# Altium footprint library AltiumDesignerLibraries.PcbLib: 313 footprints (part 11 of 20)
Each footprint in its own frame and in the unit in brackets; x right, y up, seen from the top. Pads: shape width x height; smd on the part's side, far side on the other; paste and mask are expansions set on the pad; w line width, h text height; cw(c..) or ccw(c..) is an arc to the next point about the centre after c.
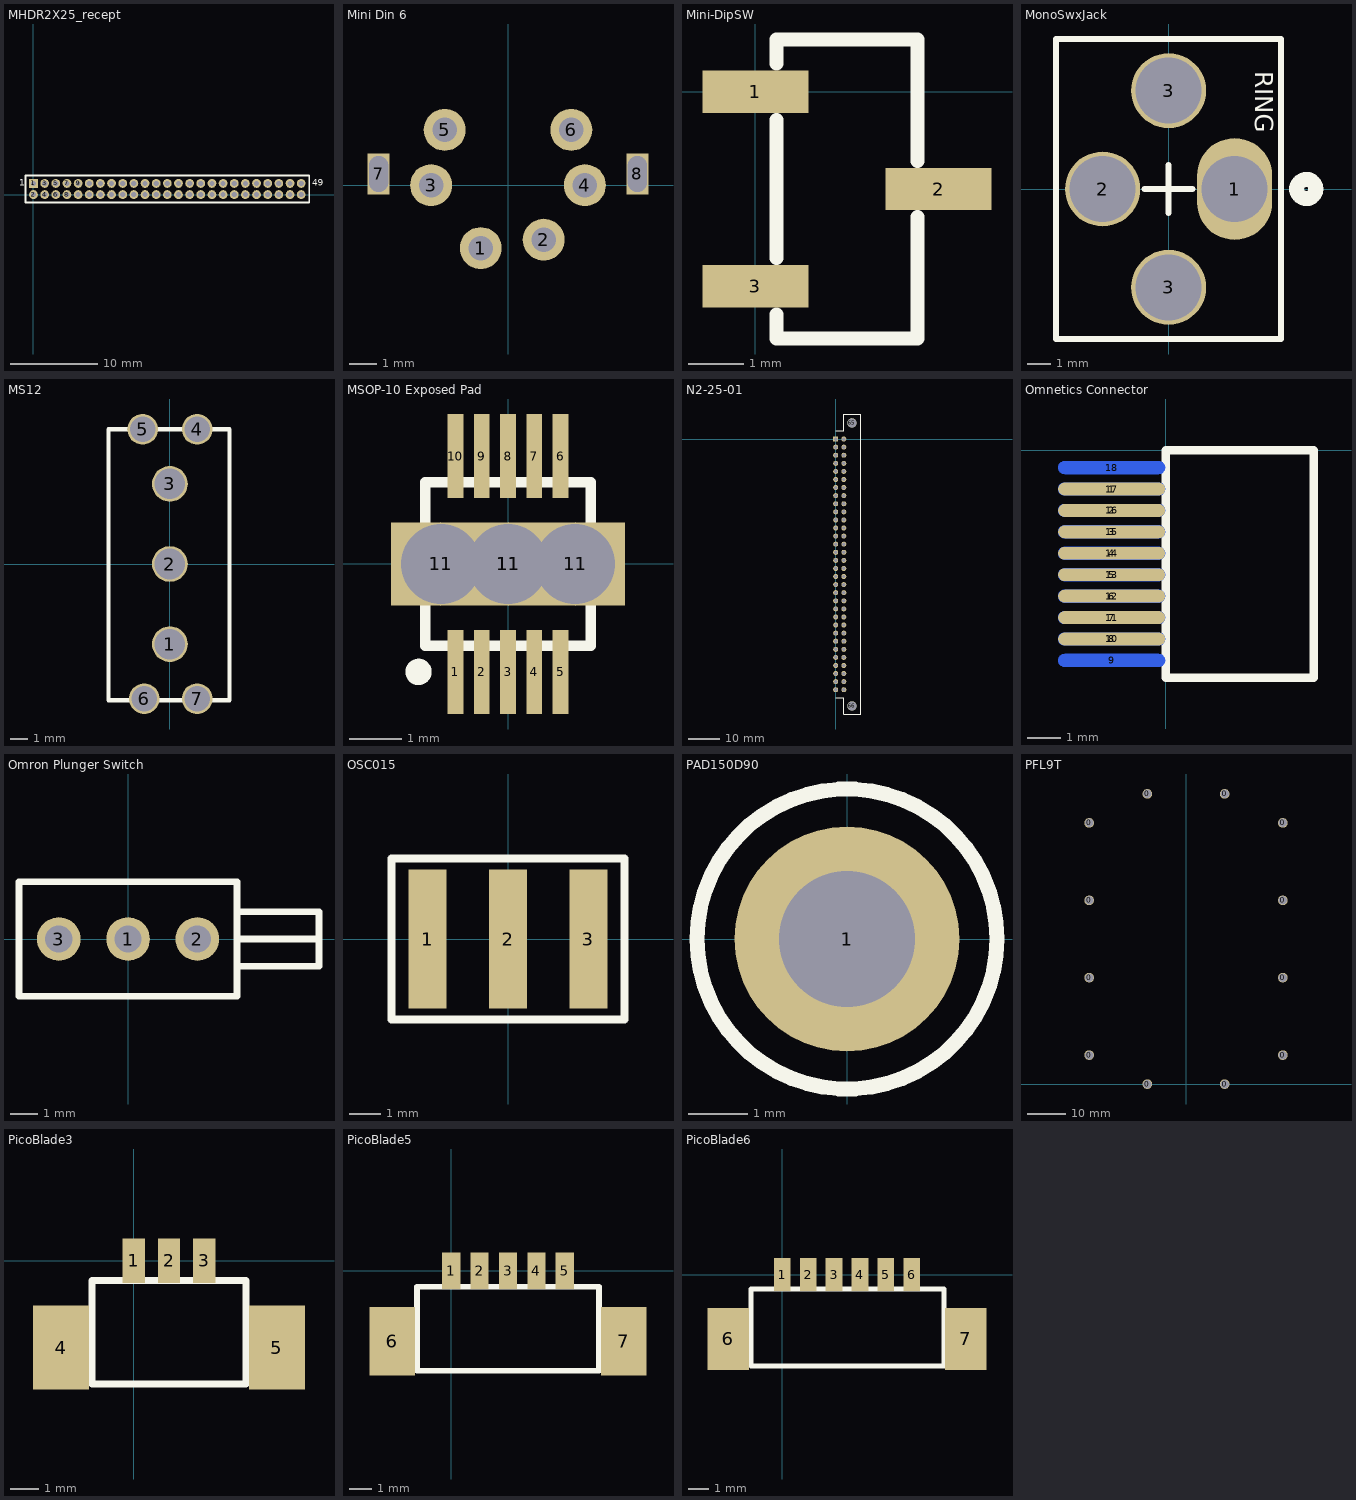
[diagram p10: the footprints below, top view; thin cyan lines are the x and y axes]

## MHDR2X25_recept [mm]
pads (50):
  rect 1x1 hole 0.6: 1(0,1.27)
  round 1 hole 0.6: 2(0,0) 3(1.27,1.27) 4(1.27,0) 5(2.54,1.27) 6(2.54,0) 7(3.81,1.27) 8(3.81,0) 9(5.08,1.27) 10(5.08,0) 11(6.35,1.27) 12(6.35,0) 13(7.62,1.27) 14(7.62,0) 15(8.89,1.27) 16(8.89,0) 17(10.16,1.27) 18(10.16,0) 19(11.43,1.27) 20(11.43,0) 21(12.7,1.27) 22(12.7,0) 23(13.97,1.27) 24(13.97,0) 25(15.24,1.27) 26(15.24,0) 27(16.51,1.27) 28(16.51,0) 29(17.78,1.27) 30(17.78,0) 31(19.05,1.27) 32(19.05,0) 33(20.32,1.27) 34(20.32,0) 35(21.59,1.27) 36(21.59,0) 37(22.86,1.27) 38(22.86,0) 39(24.13,1.27) 40(24.13,0) 41(25.4,1.27) 42(25.4,0) 43(26.67,1.27) 44(26.67,0) 45(27.94,1.27) 46(27.94,0) 47(29.21,1.27) 48(29.21,0) 49(30.48,1.27) 50(30.48,0)
Top Overlay:
  lines w0.2: -0.9,-0.9 31.394,-0.9 31.394,2.17 -0.9,2.17 -0.9,-0.9
  text "1" at -1.651,1.016 h0.76
  text "49" at 31.75,1.016 h0.76

## Mini Din 6 [mil]
pads (8):
  round 60 hole 35: 1(-39,-90) 2(51,-78) 3(-110,0) 4(110,0) 5(-90.5,79) 6(90.5,79)
  rect 31.5x59.06 hole 27.56 slot 51.18 at 90 deg: 7(-185,16) 8(185,16)
Top Overlay:
  lines w7.87: -110,0 -110,16 ; 51,-90 51,-78

## Mini-DipSW [mil] "Single surface mount dip switch"
pads (3):
  rect 75x30 smd: 1(0,0) 2(130,-69) 3(0,-138)
Top Overlay:
  lines w10: 15,-158 15,-175 115,-175 115,-89 ; 15,-118 15,-20 ; 15,20 15,37 115,37 115,-49

## MonoSwxJack [mil]
pads (4):
  oval 125x170 hole 110: 1(110,0)
  round 125 hole 110: 2(-110,0) 3(0,-164) 3(0,164)
Top Overlay:
  circle w25: c229.33,0 r16
  lines w10: -40,0 40,0 ; 0,-40 0,40 ; -187.5,-250 187.5,-250 187.5,250 -187.5,250 -187.5,-250
  text "RING" at 144.69,195.87 h30

## MS12 [mm] "Single-pole PCB mount slide switch"
pads (7):
  round 2.1 hole 1.8: 1(0,-4.7) 2(0,0) 3(0,4.7)
  round 1.8 hole 1.5: 4(1.6,7.9) 5(-1.6,7.9) 6(-1.5,-7.9) 7(1.6,-7.9)
Top Overlay:
  lines w0.254: -3.6,-8 -3.6,7.9 3.5,7.9 3.5,-8 -3.6,-8
3D body: height 13.51, standoff -4.7, extent -3.61,-8.286 3.502,8.286

## MSOP-10 Exposed Pad [mm]
pads (14):
  rect 0.3x1.6 smd: 1(-1,-2.05) 2(-0.5,-2.05) 3(0,-2.05) 4(0.5,-2.05) 5(1,-2.05) 6(1,2.05) 7(0.5,2.05) 8(0,2.05) 9(-0.5,2.05) 10(-1,2.05)
  round 1.6 hole 1.524: 11(-1.275,0) 11(0,0) 11(1.275,0)
  rect 4.445x1.57 smd: 11(0,0)
Top Overlay:
  circle w0.25: c-1.7,-2.05 r0.125
  lines w0.2: -1.575,-1.55 1.575,-1.55 1.575,1.55 -1.575,1.55 -1.575,-1.55

## N2-25-01 [mil]
pads (66):
  rect 62x62 hole 42: 1(0,0)
  round 62 hole 42: 2(0,-100) 3(0,-200) 4(0,-300) 5(0,-400) 6(0,-500) 7(0,-600) 8(0,-700) 9(0,-800) 10(0,-900) 11(0,-1000) 12(0,-1100) 13(0,-1200) 14(0,-1300) 15(0,-1400) 16(0,-1500) 17(0,-1600) 18(0,-1700) 19(0,-1800) 20(0,-1900) 21(0,-2000) 22(0,-2100) 23(0,-2200) 24(0,-2300) 25(0,-2400) 26(0,-2500) 27(0,-2600) 28(0,-2700) 29(0,-2800) 30(0,-2900) 31(0,-3000) 32(0,-3100) 33(100,0) 34(100,-100) 35(100,-200) 36(100,-300) 37(100,-400) 38(100,-500) 39(100,-600) 40(100,-700) 41(100,-800) 42(100,-900) 43(100,-1000) 44(100,-1100) 45(100,-1200) 46(100,-1300) 47(100,-1400) 48(100,-1500) 49(100,-1600) 50(100,-1700) 51(100,-1800) 52(100,-1900) 53(100,-2000) 54(100,-2100) 55(100,-2200) 56(100,-2300) 57(100,-2400) 58(100,-2500) 59(100,-2600) 60(100,-2700) 61(100,-2800) 62(100,-2900) 63(100,-3000) 64(100,-3100)
  round 115 hole 110: 65(200,200) 66(200,-3300)
Top Overlay:
  lines w10: 0,-3200 100,-3200 100,-3400 310,-3400 310,-3190 310,310 100,310 100,100 0,100

## Omnetics Connector [mil] "A8141"
pads (18):
  oval 125x15 smd: 1(-63,-45) 2(-63,-70) 3(-63,-95) 4(-63,-120) 5(-63,-145) 6(-63,-170) 7(-63,-195) 8(-63,-220)
  oval 125x15 smd far side: 9(-63,-245) 10(-63,-220) 11(-63,-195) 12(-63,-170) 13(-63,-145) 14(-63,-120) 15(-63,-95) 16(-63,-70) 17(-63,-45) 18(-63,-20)
Top Overlay:
  lines w10: 0,-265 173,-265 173,0 0,0 0,-265

## Omron Plunger Switch [mm]
pads (3):
  round 1.6 hole 1: 1(0,0) 2(2.54,0) 3(-2.54,0)
Top Overlay:
  lines w0.254: 4,-1 7,-1 7,1 4,1 ; 4,0 7,0 ; -4,-2.1 -4,2.1 4,2.1 4,-2.1 -4,-2.1

## OSC015 [mil]
pads (3):
  rect 47x173 smd mask+3: 1(-100,0) 2(0,0) 3(100,0)
Top Overlay:
  lines w10: -145,-100 145,-100 145,100 -145,100 -145,-100
Mechanical 1:
  text "U40" at -67.49,-29.99 h50

## PAD150D90 [mm]
pads (1):
  round 3.81 hole 2.301: 1(0,0)
Top Overlay:
  circle w0.254: c0,0 r2.54

## PCBComponent_1 [mm]

## PFL9T [mm] "Perancea PCB mount EMI shield"
pads (12):
  round 2.5 hole 2.25: 0(-25,7.5) 0(-25,27.5) 0(-25,47.5) 0(-25,67.5) 0(-10,0) 0(-10,75) 0(10,0) 0(10,75) 0(25,7.5) 0(25,27.5) 0(25,47.5) 0(25,67.5)

## PicoBlade3 [mm] "Surfact Mount Vertical"
height 4.7
pads (5):
  rect 0.8x1.6 smd: 1(0,0) 2(1.25,0) 3(2.5,0)
  rect 2x3 smd: 4(-2.6,-3.1) 5(5.1,-3.1)
Top Overlay:
  lines w0.254: -1.5,-4.4 4,-4.4 4,-0.7 -1.5,-0.7 -1.5,-4.4
3D body: height 4.65, standoff -0.05, extent -3.25,-4.15 5.65,0.05

## PicoBlade5 [mm] "Surfact Mount Vertical"
height 4.7
pads (7):
  rect 0.8x1.6 smd: 1(0,0) 2(1.25,0) 3(2.5,0) 4(3.75,0) 5(5,0)
  rect 2x3 smd: 6(-2.6,-3.1) 7(7.6,-3.1)
Top Overlay:
  lines w0.254: -1.5,-4.4 -1.5,-0.7 6.5,-0.7 6.5,-4.4 -1.5,-4.4
3D body: height 4.65, standoff -0.05, extent -3.2,-4.15 8.2,0.05

## PicoBlade6 [mm] "Surfact Mount Vertical"
height 4.7
pads (8):
  rect 0.8x1.6 smd: 1(0,0) 2(1.25,0) 3(2.5,0) 4(3.75,0) 5(5,0) 6(6.25,0)
  rect 2x3 smd: 6(-2.6,-3.1) 7(8.85,-3.1)
Top Overlay:
  lines w0.254: -1.5,-4.4 -1.5,-0.7 7.8,-0.7 7.8,-4.4 -1.5,-4.4
3D body: height 4.65, standoff -0.05, extent -3.225,-4.15 9.425,0.05